# Altium footprint library LimeMicroAltiumLib_pcbLib_r01.PcbLib: 434 footprints (part 7 of 29)
Each footprint in its own frame and in the unit in brackets; x right, y up, seen from the top. Pads: shape width x height; smd on the part's side, far side on the other; paste and mask are expansions set on the pad; w line width, h text height; cw(c..) or ccw(c..) is an arc to the next point about the centre after c.
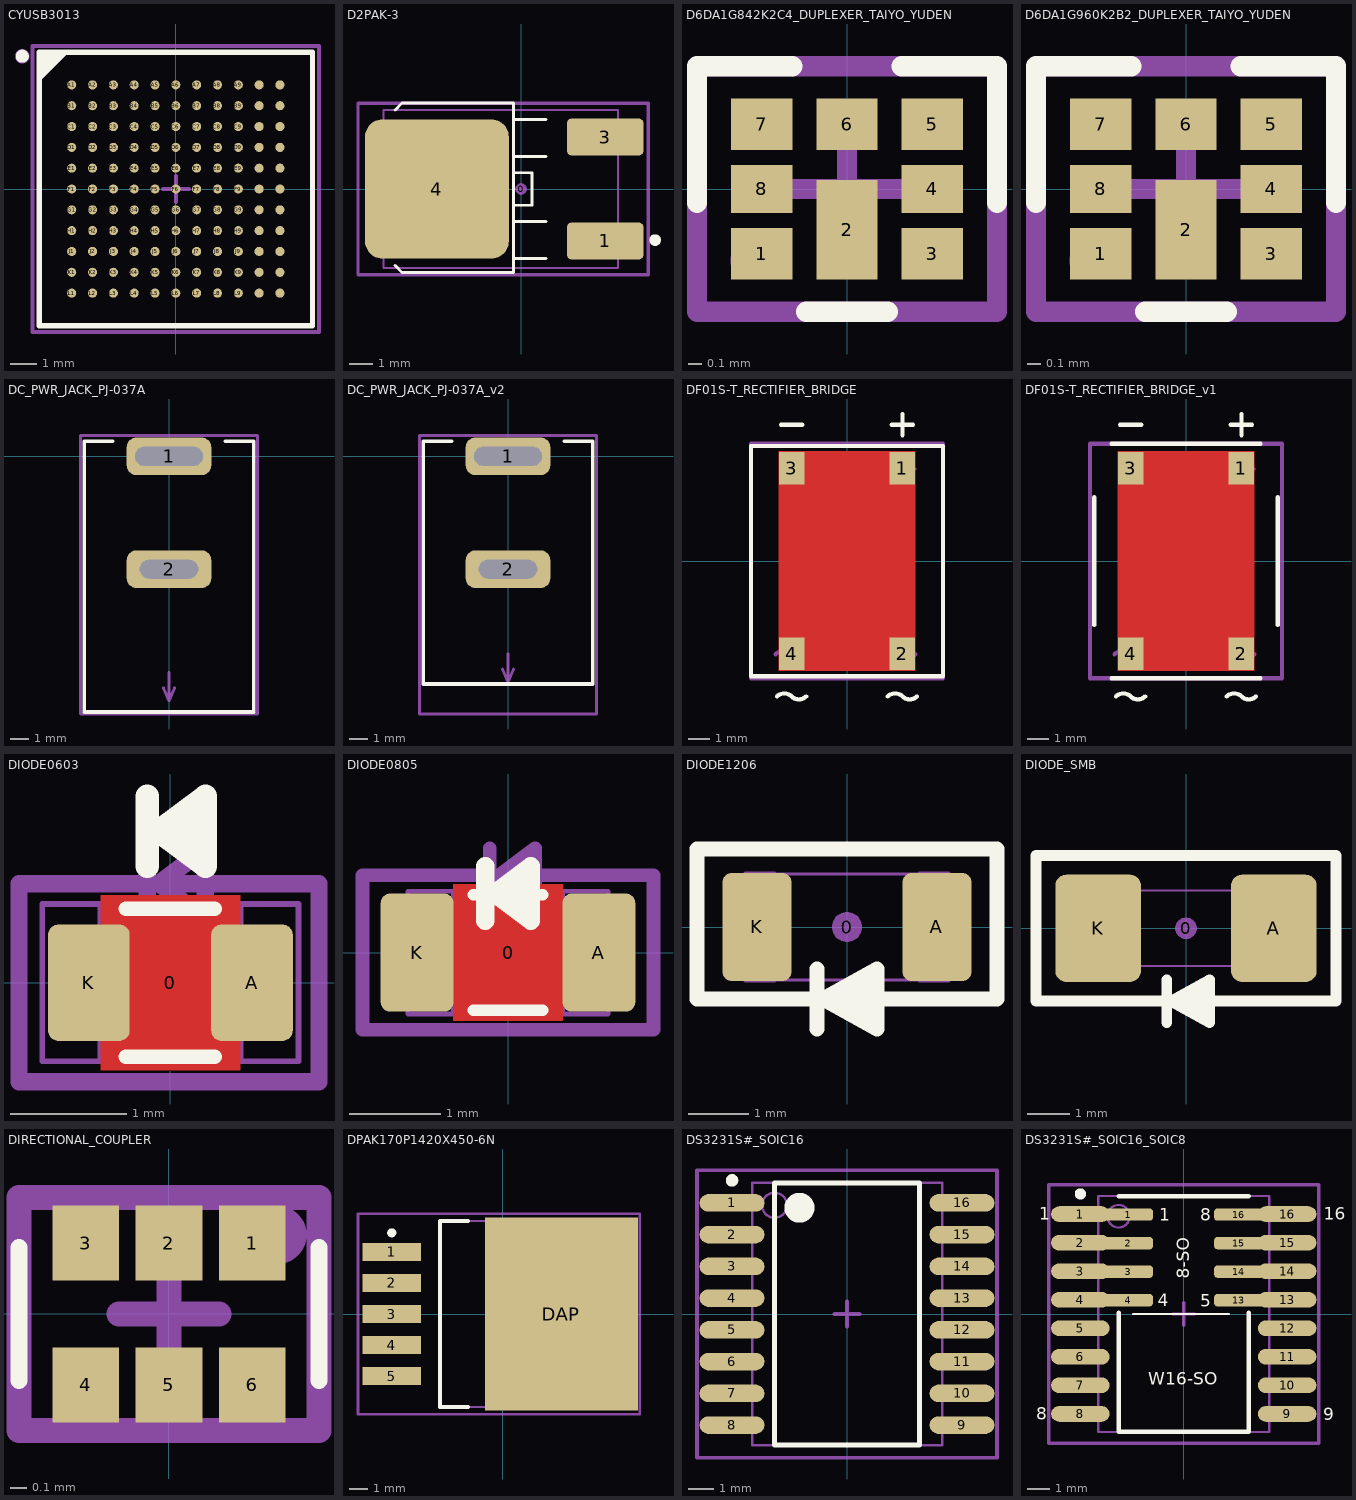
[diagram p6: the footprints below, top view; thin cyan lines are the x and y axes]

## CYUSB3013 [mm] "BGA, 121-Leads, Body 10,50x10,50mmx1,10mm, Pitch 0,80mm"
height 1.1
pads (121):
  round 0.35 smd: A1(-4,4) A2(-3.2,4) A3(-2.4,4) A4(-1.6,4) A5(-0.8,4) A6(0,4) A7(0.8,4) A8(1.6,4) A9(2.4,4) A10(3.2,4) A11(4,4) B1(-4,3.2) B2(-3.2,3.2) B3(-2.4,3.2) B4(-1.6,3.2) B5(-0.8,3.2) B6(0,3.2) B7(0.8,3.2) B8(1.6,3.2) B9(2.4,3.2) B10(3.2,3.2) B11(4,3.2) C1(-4,2.4) C2(-3.2,2.4) C3(-2.4,2.4) C4(-1.6,2.4) C5(-0.8,2.4) C6(0,2.4) C7(0.8,2.4) C8(1.6,2.4) C9(2.4,2.4) C10(3.2,2.4) C11(4,2.4) D1(-4,1.6) D2(-3.2,1.6) D3(-2.4,1.6) D4(-1.6,1.6) D5(-0.8,1.6) D6(0,1.6) D7(0.8,1.6) D8(1.6,1.6) D9(2.4,1.6) D10(3.2,1.6) D11(4,1.6) E1(-4,0.8) E2(-3.2,0.8) E3(-2.4,0.8) E4(-1.6,0.8) E5(-0.8,0.8) E6(0,0.8) E7(0.8,0.8) E8(1.6,0.8) E9(2.4,0.8) E10(3.2,0.8) E11(4,0.8) F1(-4,0) F2(-3.2,0) F3(-2.4,0) F4(-1.6,0) F5(-0.8,0) F6(0,0) F7(0.8,0) F8(1.6,0) F9(2.4,0) F10(3.2,0) F11(4,0) G1(-4,-0.8) G2(-3.2,-0.8) G3(-2.4,-0.8) G4(-1.6,-0.8) G5(-0.8,-0.8) G6(0,-0.8) G7(0.8,-0.8) G8(1.6,-0.8) G9(2.4,-0.8) G10(3.2,-0.8) G11(4,-0.8) H1(-4,-1.6) H2(-3.2,-1.6) H3(-2.4,-1.6) H4(-1.6,-1.6) H5(-0.8,-1.6) H6(0,-1.6) H7(0.8,-1.6) H8(1.6,-1.6) H9(2.4,-1.6) H10(3.2,-1.6) H11(4,-1.6) J1(-4,-2.4) J2(-3.2,-2.4) J3(-2.4,-2.4) J4(-1.6,-2.4) J5(-0.8,-2.4) J6(0,-2.4) J7(0.8,-2.4) J8(1.6,-2.4) J9(2.4,-2.4) J10(3.2,-2.4) J11(4,-2.4) K1(-4,-3.2) K2(-3.2,-3.2) K3(-2.4,-3.2) K4(-1.6,-3.2) K5(-0.8,-3.2) K6(0,-3.2) K7(0.8,-3.2) K8(1.6,-3.2) K9(2.4,-3.2) K10(3.2,-3.2) K11(4,-3.2) L1(-4,-4) L2(-3.2,-4) L3(-2.4,-4) L4(-1.6,-4) L5(-0.8,-4) L6(0,-4) L7(0.8,-4) L8(1.6,-4) L9(2.4,-4) L10(3.2,-4) L11(4,-4)
Top Overlay:
  circle w0.25: c-5.9,5.1 r0.125
  region: -4.25,5.25 -5.25,4.25 -5.25,5.25
  lines w0.2: -5.25,4.25 -4.25,5.25 ; -5.25,-5.25 -5.25,5.25 5.25,5.25 5.25,-5.25 -5.25,-5.25
Mechanical 13:
  lines w0.1: -5.25,-5.25 -5.25,5.25 5.25,5.25 5.25,-5.25 -5.25,-5.25
Mechanical 15:
  circle w0.35: c-5.9,5.1 r0.1
  lines w0.15: -0.5,0 0.5,0 ; 0,-0.5 0,0.5 ; -5.5,-5.5 -5.5,5.5 5.5,5.5 5.5,-5.5 -5.5,-5.5
  text ".Designator" at 0,0 h0.55
3D body: height 1.1, standoff 1, extent -4.4,3.6 -3.6,4.4
3D body: height 1.1, standoff 0.25, extent -5.25,-5.25 5.25,5.25

## D2PAK-3 [mm] "D-PAK/TO-263-3; 3 Leads (1 Cropped); Body 14.7 (inc. leads) x 10.2 mm (LxW max)"
height 4.572
pads (4):
  round 0.508 on Mech15: 0(0,0)
  rrect25% 3.3x1.6 smd: 1(3.626,-2.24) 3(3.626,2.24)
  rrect25% 6.2x6 smd: 4(-3.626,0)
Top Overlay:
  circle w0.25: c5.774,-2.2 r0.125
  lines w0.127: -5.426,-3.3 -5.126,-3.6 -0.326,-3.6 -0.326,3.7 -5.126,3.7 -5.426,3.4 ; 1.074,-3 -0.326,-3 -0.326,-1.4 1.074,-1.4 ; 1.074,1.4 -0.326,1.4 -0.326,3 1.074,3 ; -0.326,-0.7 0.474,-0.7 0.474,0.7 -0.326,0.7 -0.326,-0.7
Mechanical 13:
  lines w0.076: -5.928,-3.4 -5.928,3.4 4.174,3.4 4.174,-3.4 -5.928,-3.4
Mechanical 15:
  circle w0.3: c3.674,-2.2 r0.1
  lines w0.15: -7.026,-3.7 5.474,-3.7 5.474,3.7 -7.026,3.7 -7.026,-3.7
  text ".Designator" at 0,0 h0.55
3D body "User Library-DPAK_TO-252AA.step": height 2.37, standoff -0.03, extent -5.928,-3.367 4.172,3.367

## D6DA1G842K2C4_DUPLEXER_TAIYO_YUDEN [mm]
pads (8):
  rect 0.45x0.38 smd mask+0.05: 1(-0.625,-0.475) 3(0.625,-0.475) 5(0.625,0.475) 6(0,0.475) 7(-0.625,0.475)
  rect 0.45x0.73 smd mask+0.05: 2(0,-0.3)
  rect 0.45x0.35 smd mask+0.05: 4(0.625,0) 8(-0.625,0)
Top Overlay:
  lines w0.15: -1.1,-0.1 -1.1,0.9 -0.4,0.9 ; -0.3,-0.9 0.3,-0.9 ; 0.4,0.9 1.1,0.9 1.1,-0.1
Top Solder:
  region: -0.9,0.715 -0.9,-0.715 0.9,-0.715 0.9,0.715
Mechanical 13:
  region: -0.775,-0.6 -0.775,-0.37 -0.475,-0.37 -0.475,-0.6
  region: -0.775,-0.14 -0.775,0.09 -0.475,0.09 -0.475,-0.14
  region: -0.775,0.32 -0.775,0.55 -0.475,0.55 -0.475,0.32
  region: -0.15,0.32 -0.15,0.55 0.15,0.55 0.15,0.32
  region: 0.775,0.32 0.775,0.55 0.475,0.55 0.475,0.32
  region: 0.775,-0.14 0.775,0.09 0.475,0.09 0.475,-0.14
  region: 0.775,-0.6 0.775,-0.37 0.475,-0.37 0.475,-0.6
  region: -0.15,-0.6 -0.15,-0.025 0.15,-0.025 0.15,-0.6
Mechanical 15:
  circle w0.15: c-0.725,-0.525 r0.056
  lines w0.15: -0.4,0 0,0 ; 0,-0.4 0,0 ; 0,0.4 0,0 ; 0.4,0 0,0 ; -1.1,-0.9 1.1,-0.9 1.1,0.9 -1.1,0.9 -1.1,-0.9
  text ".Designator" at 0,0 h0.55
3D body: height 0.59, standoff 0, extent -0.724,-0.57 -0.525,-0.37
3D body: height 0.57, standoff 0, extent -0.9,-0.7 0.9,0.7

## D6DA1G960K2B2_DUPLEXER_TAIYO_YUDEN [mm]
pads (8):
  rect 0.45x0.38 smd mask+0.05: 1(-0.625,-0.475) 3(0.625,-0.475) 5(0.625,0.475) 6(0,0.475) 7(-0.625,0.475)
  rect 0.45x0.73 smd mask+0.05: 2(0,-0.3)
  rect 0.45x0.35 smd mask+0.05: 4(0.625,0) 8(-0.625,0)
Top Overlay:
  lines w0.15: -1.1,-0.1 -1.1,0.9 -0.4,0.9 ; -0.3,-0.9 0.3,-0.9 ; 0.4,0.9 1.1,0.9 1.1,-0.1
Top Solder:
  region: -0.9,0.715 -0.9,-0.715 0.9,-0.715 0.9,0.715
Mechanical 13:
  region: -0.775,-0.6 -0.775,-0.37 -0.475,-0.37 -0.475,-0.6
  region: -0.775,-0.14 -0.775,0.09 -0.475,0.09 -0.475,-0.14
  region: -0.775,0.32 -0.775,0.55 -0.475,0.55 -0.475,0.32
  region: -0.15,0.32 -0.15,0.55 0.15,0.55 0.15,0.32
  region: 0.775,0.32 0.775,0.55 0.475,0.55 0.475,0.32
  region: 0.775,-0.14 0.775,0.09 0.475,0.09 0.475,-0.14
  region: 0.775,-0.6 0.775,-0.37 0.475,-0.37 0.475,-0.6
  region: -0.15,-0.6 -0.15,-0.025 0.15,-0.025 0.15,-0.6
Mechanical 15:
  circle w0.15: c-0.725,-0.525 r0.056
  lines w0.15: -0.4,0 0,0 ; 0,-0.4 0,0 ; 0,0.4 0,0 ; 0.4,0 0,0 ; -1.1,-0.9 1.1,-0.9 1.1,0.9 -1.1,0.9 -1.1,-0.9
  text ".Designator" at 0,0 h0.55
3D body: height 0.59, standoff 0, extent -0.724,-0.57 -0.525,-0.37
3D body: height 0.57, standoff 0, extent -0.9,-0.7 0.9,0.7

## DC_PWR_JACK_PJ-037A [mm]
pads (2):
  rrect50% 4.5x2 hole 1 slot 3.6 at 0 deg mask+0.05: 1(0,0)
  rrect50% 4.5x2 hole 1 slot 3.1 at 0 deg mask+0.05: 2(0,-6)
Top Overlay:
  lines w0.2: -3,0.8 -4.5,0.8 -4.5,-13.6 4.5,-13.6 4.5,0.8 3,0.8
Mechanical 15:
  lines w0.15: -0.3,-12.3 0,-13 ; 0,-11.5 0,-13 ; 0.3,-12.3 0,-13 ; -4.7,-13.7 -4.7,1.1 4.7,1.1 4.7,-13.7 -4.7,-13.7
  text ".Designator" at 0,0 h0.55
  text "board edge" at -2.6,-11.1 h0.55
3D body "CUI_PJ-037A.step": height 11, standoff -3.5, extent -4.5,-13.7 4.5,0.8

## DC_PWR_JACK_PJ-037A_v2 [mm]
pads (2):
  rrect50% 4.5x2 hole 1 slot 3.6 at 0 deg mask+0.05: 1(0,0)
  rrect50% 4.5x2 hole 1 slot 3.1 at 0 deg mask+0.05: 2(0,-6)
Top Overlay:
  lines w0.2: -3,0.8 -4.5,0.8 -4.5,-12.1 4.5,-12.1 4.5,0.8 3,0.8
Mechanical 15:
  lines w0.15: -0.3,-11.3 0,-12 ; 0,-10.5 0,-12 ; 0.3,-11.3 0,-12 ; -4.7,-13.7 4.7,-13.7 4.7,1.1 -4.7,1.1 -4.7,-13.7
  text "board edge" at -2.6,-10.1 h0.55
  text ".Designator" at 0,0 h0.55
3D body "CUI_PJ-037A.step": height 11, standoff -3.5, extent -4.5,-13.7 4.5,0.8

## DF01S-T_RECTIFIER_BRIDGE [mm]
pads (4):
  rect 1.2x1.52 smd mask+0.05: 1(2.6,4.35) 2(2.6,-4.35) 3(-2.6,4.35) 4(-2.6,-4.35)
Top Layer:
  pour cut-out: -3.2,-5.15 -3.2,5.15 3.2,5.15 3.2,-5.15
Top Overlay:
  lines w0.2: -3.283,-6.35 cw(c-2.941,-6.691) -2.941,-6.209 cw(c-2.941,-6.691) -2.6,-6.35 ccw(c-2.259,-6.009) -2.259,-6.491 ccw(c-2.259,-6.009) -1.917,-6.35 ; -3.1,6.4 -2.1,6.4 ; 1.917,-6.35 cw(c2.259,-6.691) 2.259,-6.209 cw(c2.259,-6.691) 2.6,-6.35 ccw(c2.941,-6.009) 2.941,-6.491 ccw(c2.941,-6.009) 3.283,-6.35 ; 2.1,6.4 3.1,6.4 ; 2.6,5.9 2.6,6.9 ; -4.5,-5.4 -4.5,5.4 4.5,5.4 4.5,-5.4 -4.5,-5.4
Mechanical 15:
  lines w0.2: -3.358,-4.375 cw(c-3.016,-4.716) -3.016,-4.234 cw(c-3.016,-4.716) -2.675,-4.375 ccw(c-2.334,-4.034) -2.334,-4.516 ccw(c-2.334,-4.034) -1.992,-4.375 ; -3.05,4.325 -2.05,4.325 ; -1,0 1,0 ; 0,-1 0,1 ; 1.842,-4.375 cw(c2.184,-4.716) 2.184,-4.234 cw(c2.184,-4.716) 2.525,-4.375 ccw(c2.866,-4.034) 2.866,-4.516 ccw(c2.866,-4.034) 3.208,-4.375 ; 2.15,4.325 3.15,4.325 ; 2.65,3.825 2.65,4.825 ; -4.5,-5.5 4.5,-5.5 4.5,5.5 -4.5,5.5 -4.5,-5.5
  text ".Designator" at 0,0 h0.55
3D body "User Library-DFXXS.step": height 3.6, standoff 0.03, extent -4.255,-5.15 4.255,5.15

## DF01S-T_RECTIFIER_BRIDGE_v1 [mm]
pads (4):
  rect 1.2x1.52 smd mask+0.05: 1(2.6,4.35) 2(2.6,-4.35) 3(-2.6,4.35) 4(-2.6,-4.35)
Top Layer:
  pour cut-out: -3.2,-5.15 -3.2,5.15 3.2,5.15 3.2,-5.15
Top Overlay:
  lines w0.2: -4.3,-3 -4.3,3 ; -3.5,-5.5 3.5,-5.5 ; -3.5,5.5 3.5,5.5 ; -3.283,-6.35 cw(c-2.941,-6.691) -2.941,-6.209 cw(c-2.941,-6.691) -2.6,-6.35 ccw(c-2.259,-6.009) -2.259,-6.491 ccw(c-2.259,-6.009) -1.917,-6.35 ; -3.1,6.4 -2.1,6.4 ; 1.917,-6.35 cw(c2.259,-6.691) 2.259,-6.209 cw(c2.259,-6.691) 2.6,-6.35 ccw(c2.941,-6.009) 2.941,-6.491 ccw(c2.941,-6.009) 3.283,-6.35 ; 2.1,6.4 3.1,6.4 ; 2.6,5.9 2.6,6.9 ; 4.3,-3 4.3,3
Mechanical 15:
  lines w0.2: -3.358,-4.375 cw(c-3.016,-4.716) -3.016,-4.234 cw(c-3.016,-4.716) -2.675,-4.375 ccw(c-2.334,-4.034) -2.334,-4.516 ccw(c-2.334,-4.034) -1.992,-4.375 ; -3.05,4.325 -2.05,4.325 ; -1,0 1,0 ; 0,-1 0,1 ; 1.842,-4.375 cw(c2.184,-4.716) 2.184,-4.234 cw(c2.184,-4.716) 2.525,-4.375 ccw(c2.866,-4.034) 2.866,-4.516 ccw(c2.866,-4.034) 3.208,-4.375 ; 2.15,4.325 3.15,4.325 ; 2.65,3.825 2.65,4.825 ; -4.5,-5.5 -4.5,5.5 4.5,5.5 4.5,-5.5 -4.5,-5.5
  text ".Designator" at 0,0 h0.55
3D body "User Library-DFXXS.step": height 3.6, standoff 0.03, extent -4.255,-5.15 4.255,5.15

## DIODE0603 [mm]
height 0.7
pads (3):
  round 0.254 on Mech15: 0(0,0)
  rrect25% 0.7x1 smd: A(0.7,0) K(-0.7,0)
Top Layer:
  pour cut-out: -0.6,0.75 0.6,0.75 0.6,-0.75 -0.6,-0.75
Top Overlay:
  lines w0.127: -0.381,-0.635 0.381,-0.635 ; -0.381,0.635 0.381,0.635
  lines w0.2: -0.2,1 -0.2,1.6 ; -0.1,1.3 0.3,1 0.3,1.6 ; -0.1,1.3 0.3,1.6 ; -0.1,1.3 0.3,1.3 0.3,1.6
Mechanical 13:
  lines w0.05: 0.6,-0.674 -0.6,-0.674 ; -0.6,-0.675 -0.6,0.675 -1.1,0.675 -1.1,-0.675 -0.6,-0.675 ; -0.6,-0.674 0.6,-0.674 ; 0.6,-0.675 0.6,0.675 ; 0.6,-0.675 1.1,-0.675 1.1,0.675 0.6,0.675 ; 0.6,0.674 -0.6,0.674 0.6,0.674
Mechanical 15:
  lines w0.15: -0.2,0.55 -0.2,1.15 ; -0.1,0.85 0.3,0.85 0.3,1.15 ; -0.1,0.85 0.3,1.15 ; -0.1,0.85 0.3,0.55 0.3,1.15 ; -1.3,-0.85 1.275,-0.85 1.275,0.85 -1.3,0.85 -1.3,-0.85
  text ".Designator" at 0,0 h0.55
  text "A" at 0.5,-0.375 h0.55
  text "C" at -1.05,-0.4 h0.55
3D body "RES 0805 (2012 metric).STEP": height 0.69, standoff -0.01, extent -1.1,-0.675 1.1,0.675

## DIODE0805 [mm] "Chip Resistor, Body 2.0x1.2mm, 0805, IPC Medium Density"
height 0.7
pads (3):
  round 0.254 on Mech15: 0(0,0)
  rrect25% 0.8x1.3 smd: A(1,0) K(-1,0)
Top Layer:
  pour cut-out: -0.6,0.75 0.6,0.75 0.6,-0.75 -0.6,-0.75
Top Overlay:
  lines w0.127: -0.381,-0.635 0.381,-0.635 ; -0.381,0.635 0.381,0.635
  lines w0.2: -0.25,0.35 -0.25,0.95 ; -0.15,0.65 0.25,0.65 0.25,0.95 ; -0.15,0.65 0.25,0.95 ; -0.15,0.65 0.25,0.35 0.25,0.95
Mechanical 13:
  lines w0.05: 0.6,-0.674 -0.6,-0.674 ; -0.6,-0.674 0.6,-0.674 ; -0.6,-0.675 -1.1,-0.675 -1.1,0.675 -0.6,0.675 -0.6,-0.675 ; 0.6,-0.675 1.1,-0.675 1.1,0.675 0.6,0.675 ; 0.6,-0.675 0.6,0.675 ; 0.6,0.674 -0.6,0.674 0.6,0.674
Mechanical 15:
  lines w0.15: -0.2,0.55 -0.2,1.15 ; -0.1,0.85 0.3,0.55 0.3,1.15 ; -0.1,0.85 0.3,1.15 ; -0.1,0.85 0.3,0.85 0.3,1.15 ; -1.6,-0.85 -1.6,0.85 1.6,0.85 1.6,-0.85 -1.6,-0.85
  text "C" at -1.275,-0.3 h0.55
  text "A" at 0.7,-0.3 h0.55
  text ".Designator" at 0,0 h0.55
3D body "RES 0805 (2012 metric).STEP": height 0.69, standoff -0.01, extent -1.1,-0.675 1.1,0.675

## DIODE1206 [mm]
height 1.6
pads (3):
  round 0.508 on Mech15: 0(0,0)
  rrect25% 1.15x1.8 smd: A(1.5,0) K(-1.5,0)
Top Overlay:
  lines w0.254: -0.5,-1.7 -0.5,-0.7 ; 0,-1.4 0.5,-1.4 ; 0.1,-1 0.5,-1 ; 0.5,-1.2 0.3,-1.2 -0.4,-1.2 ; -0.4,-1.2 0.5,-1.7 0.5,-0.7 -0.4,-1.2 ; -2.5,-1.2 -2.5,1.3 2.5,1.3 2.5,-1.2 -2.5,-1.2
Mechanical 13:
  lines w0.05: -1.2,-0.88 1.2,-0.88 ; -1.2,0.88 1.2,0.88 ; -1.7,-0.9 -1.7,0.9 -1.2,0.9 -1.2,-0.9 -1.7,-0.9 ; 1.2,-0.9 1.2,0.9 1.7,0.9 1.7,-0.9 1.2,-0.9
Mechanical 15:
  lines w0.15: -0.5,-1.7 -0.5,-0.7 ; 0,-1.4 0.5,-1.4 ; 0.1,-1 0.5,-1 ; 0.5,-1.2 0.3,-1.2 -0.4,-1.2 ; -0.4,-1.2 0.5,-0.7 0.5,-1.7 -0.4,-1.2 ; -2.5,-1.2 2.5,-1.2 2.5,1.3 -2.5,1.3 -2.5,-1.2
  text ".Designator" at 0,0 h0.55
3D body "CAP_1206.STEP": height 1.74, standoff -0.01, extent -1.7,-0.9 1.7,0.9

## DIODE_SMB [mm]
height 1.6
pads (3):
  round 0.508 on Mech15: 0(0,0)
  rrect25% 2x2.5 smd: A(2.05,0) K(-2.05,0)
Top Overlay:
  lines w0.254: -0.45,-2.2 -0.45,-1.2 ; 0.05,-1.9 0.55,-1.9 ; 0.15,-1.5 0.55,-1.5 ; 0.55,-1.7 0.35,-1.7 -0.35,-1.7 ; -0.35,-1.7 0.55,-2.2 0.55,-1.2 -0.35,-1.7 ; -3.5,-1.7 -3.5,1.7 3.5,1.7 3.5,-1.7 -3.5,-1.7
Mechanical 13:
  lines w0.05: -1.2,-0.88 1.2,-0.88 ; -1.2,0.88 1.2,0.88 ; -1.7,-0.9 -1.7,0.9 -1.2,0.9 -1.2,-0.9 -1.7,-0.9 ; 1.2,-0.9 1.2,0.9 1.7,0.9 1.7,-0.9 1.2,-0.9
Mechanical 15:
  lines w0.15: -0.45,-2.2 -0.45,-1.2 ; 0.05,-1.9 0.55,-1.9 ; 0.15,-1.5 0.55,-1.5 ; 0.55,-1.7 0.35,-1.7 -0.35,-1.7 ; -0.35,-1.7 0.55,-1.2 0.55,-2.2 -0.35,-1.7 ; -3.5,-1.7 3.5,-1.7 3.5,1.7 -3.5,1.7 -3.5,-1.7
  text "A" at 1.7,-0.5 h0.55
  text "C" at -2.2,-0.5 h0.55
  text ".Designator" at 0,0 h0.55
3D body "DO-214AA.STEP": height 2.62, standoff 0, extent -2.7,-2 2.9,1.95

## DIRECTIONAL_COUPLER [mm]
height 0.7
pads (6):
  rect 0.4x0.45 smd mask+0.05: 1(0.5,0.425) 2(0,0.425) 3(-0.5,0.425) 4(-0.5,-0.425) 5(0,-0.425) 6(0.5,-0.425)
Top Overlay:
  lines w0.1: -0.9,-0.4 -0.9,0.4 ; 0.9,-0.4 0.9,0.4
Mechanical 15:
  circle w0.3: c0.65,0.475 r0.025
  lines w0.15: -0.3,0 0.3,0 ; 0,-0.3 0,0.3 ; -0.9,-0.7 0.9,-0.7 0.9,0.7 -0.9,0.7 -0.9,-0.7
  text ".Designator" at 0,0 h0.55
3D body: height 0.6, standoff 0, extent -0.8,-0.4 0.8,0.4
3D body: height 0.6, standoff 0, extent 0.463,-0.075 0.663,0.15
3D body: height 0.6, standoff 0, extent -0.65,-0.425 -0.35,-0.275
3D body: height 0.6, standoff 0, extent -0.15,-0.425 0.15,-0.275
3D body: height 0.6, standoff 0, extent 0.35,-0.425 0.65,-0.275
3D body: height 0.6, standoff 0, extent 0.35,0.275 0.65,0.425
3D body: height 0.6, standoff 0, extent -0.15,0.275 0.15,0.425
3D body: height 0.6, standoff 0, extent -0.65,0.275 -0.35,0.425

## DPAK170P1420X450-6N [mm] "D2-PAK, 6-Pads, Body 7,75x8,46mm (max), IPC Medium Density"
height 4.5
pads (6):
  rect 3.2x1 smd: 1(-6.1,3.4) 2(-6.1,1.7) 3(-6.1,0) 4(-6.1,-1.7) 5(-6.1,-3.4)
  rect 8.38x10.6 smd: DAP(3.2,0)
Top Overlay:
  circle w0.25: c-6.1,4.45 r0.125
  lines w0.2: -1.9,-5.1 -3.45,-5.1 -3.45,5.1 -1.9,5.1
Mechanical 13:
  lines w0.1: -3.45,-5.1 -3.45,5.1 5.85,5.1 5.85,-5.1 -3.45,-5.1
Mechanical 15:
  circle w0.35: c-6.225,3.425 r0.103
  lines w0.15: -0.5,0 0.5,0 ; 0,-0.5 0,0.5 ; -7.95,-5.5 -7.95,5.5 7.5,5.5 7.5,-5.5 -7.95,-5.5
  text ".Designator" at 0,0 h0.55
3D body: height 4.5, standoff 0, extent -3.45,-5.1 5.85,5.1

## DS3231S#_SOIC16 [mm] "SOIC, 16-Leads, Body 10.3x7.5mm, Pitch 1.27mm, IPC Low Density"
height 2.65
pads (16):
  oval 2.6x0.7 smd: 1(-4.6,4.445) 2(-4.6,3.175) 3(-4.6,1.905) 4(-4.6,0.635) 5(-4.6,-0.635) 6(-4.6,-1.905) 7(-4.6,-3.175) 8(-4.6,-4.445) 9(4.6,-4.445) 10(4.6,-3.175) 11(4.6,-1.905) 12(4.6,-0.635) 13(4.6,0.635) 14(4.6,1.905) 15(4.6,3.175) 16(4.6,4.445)
Top Overlay:
  circle w0.6: c-1.9,4.25 r0.3
  circle w0.25: c-4.6,5.345 r0.125
  lines w0.2: -2.9,-5.25 2.9,-5.25 2.9,5.25 -2.9,5.25 -2.9,-5.25
Mechanical 13:
  circle w0.1: c-2.9,4.35 r0.5
  lines w0.1: -3.8,-5.25 3.8,-5.25 3.8,5.25 -3.8,5.25 -3.8,-5.25
Mechanical 15:
  circle w0.25: c-4.6,4.4 r0.1
  lines w0.15: -0.5,0 0.5,0 ; 0,-0.5 0,0.5 ; -6,-5.75 6,-5.75 6,5.75 -6,5.75 -6,-5.75
  text ".Designator" at 0,0 h0.55
3D body "User Library-SOIC16-300.step": height 2.65, standoff 0, extent -5.15,-5.15 5.15,5.15

## DS3231S#_SOIC16_SOIC8 [mm] "SOIC, 16-Leads, Body 10.3x7.5mm, Pitch 1.27mm, IPC Low Density"
height 2.65
pads (24):
  oval 2.6x0.7 smd: 1(-4.6,4.445) 2(-4.6,3.175) 3(-4.6,1.905) 4(-4.6,0.635) 5(-4.6,-0.635) 6(-4.6,-1.905) 7(-4.6,-3.175) 8(-4.6,-4.445) 9(4.6,-4.445) 10(4.6,-3.175) 11(4.6,-1.905) 12(4.6,-0.635) 13(4.6,0.635) 14(4.6,1.905) 15(4.6,3.175) 16(4.6,4.445)
  rrect50% 2.2x0.55 smd mask+0.05: 1(-2.475,4.425) 2(-2.475,3.155) 3(-2.475,1.885) 4(-2.475,0.615) 13(2.455,0.615) 14(2.455,1.885) 15(2.455,3.155) 16(2.455,4.425)
Top Overlay:
  circle w0.25: c-4.6,5.345 r0.125
  lines w0.1: -2.25,0 2,0
  lines w0.2: -2.9,0.05 -2.9,-5.25 2.9,-5.25 2.9,0.05 ; -2.9,5.25 2.9,5.25
  text "5" at 0.725,0.325 h0.55
  text "4" at -1.15,0.35 h0.55
  text "8" at 0.725,4.15 h0.55
  text "16" at 6.225,4.2 h0.55
  text "9" at 6.2,-4.725 h0.55
  text "8" at -6.575,-4.7 h0.55
  text "1" at -1.1,4.15 h0.55
  text "1" at -6.425,4.2 h0.55
  text "W16-SO" at -1.575,-3.15 h0.55
  text "8-SO" at 0.25,1.575 h0.55
Mechanical 13:
  circle w0.1: c-2.9,4.35 r0.5
  lines w0.1: -3.8,-5.25 -3.8,5.25 3.8,5.25 3.8,-5.25 -3.8,-5.25
Mechanical 15:
  circle w0.25: c-4.6,4.4 r0.1
  lines w0.15: -0.5,0 0.5,0 ; 0,-0.5 0,0.5 ; -6,-5.75 -6,5.75 6,5.75 6,-5.75 -6,-5.75
  text ".Designator" at 0,0 h0.55
3D body "User Library-SOIC16-300.step": height 2.65, standoff 0, extent -5.15,-5.15 5.15,5.15